# Altium footprint library BRT_Components.PcbLib: 132 footprints (part 2 of 9)
Each footprint in its own frame and in the unit in brackets; x right, y up, seen from the top. Pads: shape width x height; smd on the part's side, far side on the other; paste and mask are expansions set on the pad; w line width, h text height; cw(c..) or ccw(c..) is an arc to the next point about the centre after c.
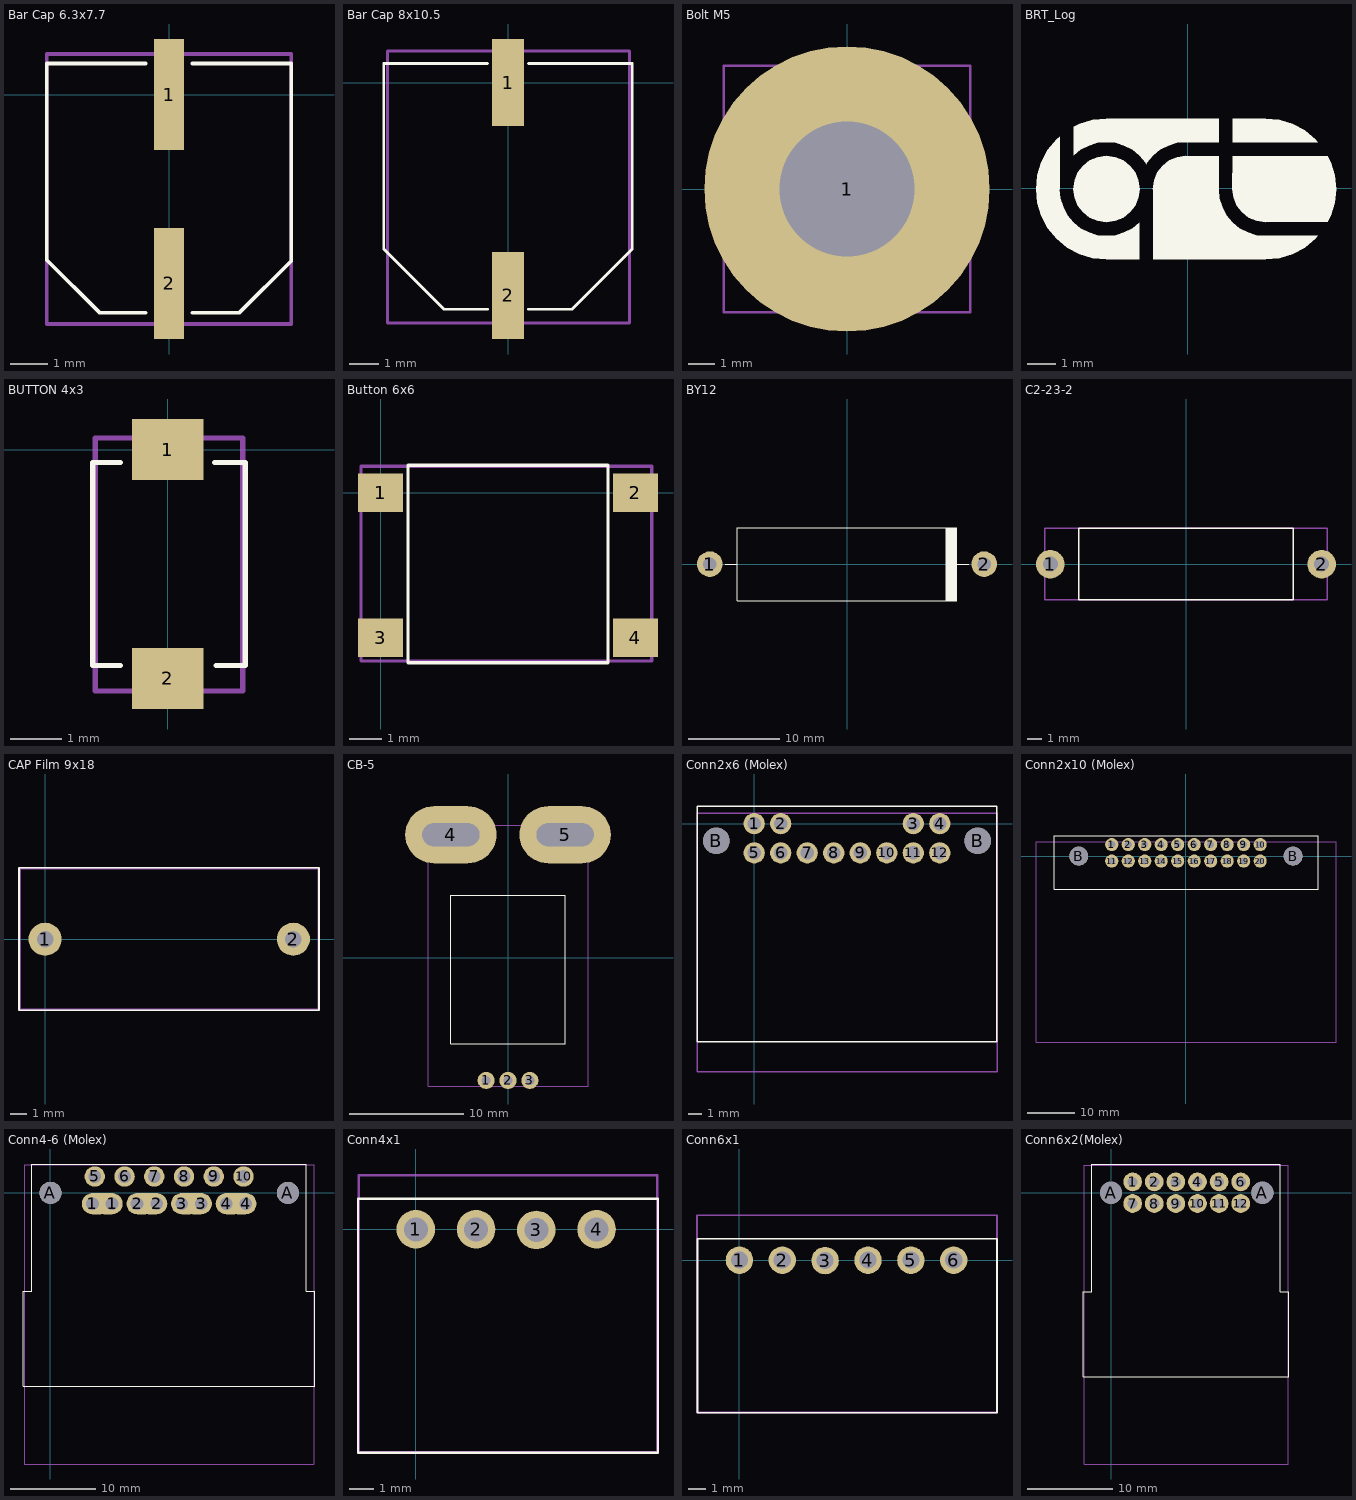
[diagram p1: the footprints below, top view; thin cyan lines are the x and y axes]

## Bar Cap 6.3x7.7 [mm]
pads (2):
  rect 0.8x3 smd: 1(0,0) 2(0,-5.105)
Top Overlay:
  lines w0.1: -0.635,-5.893 -1.88,-5.893 -3.302,-4.47 -3.302,0.838 -0.635,0.838 ; 0.635,-5.893 1.905,-5.893 3.302,-4.496 3.302,0.838 0.635,0.838
Mechanical 13:
  lines w0.1: -3.302,-6.198 -3.302,1.092 3.302,1.092 3.302,-6.198 -3.302,-6.198
3D body "User Library-E-cap_H.step": height 7.7, standoff 0, extent -3.3,-6.19 3.3,1.11

## Bar Cap 8x10.5 [mm]
pads (2):
  rect 1.1x3 smd: 1(0,0) 2(0,-7.325)
Top Overlay:
  lines w0.1: -0.7,-7.8 -2.2,-7.8 -4.275,-5.725 -4.275,0.65 -0.7,0.65 ; 0.7,-7.8 2.2,-7.8 4.275,-5.725 4.275,0.65 0.7,0.65
Mechanical 13:
  lines w0.1: -4.15,-8.275 4.175,-8.275 4.175,1.092 -4.15,1.092 -4.15,-8.275
3D body "User Library-8x10,5F.step": height 10.31, standoff -0.01, extent -4.137,-8.235 4.163,1.065

## Bolt M5 [mm]
pads (1):
  round 11 hole 5.2: 1(0,0)
Bottom Overlay:
  circle w0.254: c0,0 r5.78
Mechanical 13:
  lines w0.1: -4.75,-4.75 4.75,-4.75 4.75,4.75 -4.75,4.75 -4.75,-4.75
3D body "Bolt M5.STEP": height 9.5, standoff -3.24, extent -4.75,-4.75 4.75,4.75

## BRT_Log [mm]
Top Overlay:
  region: -4.57,-0.029 -4.579,-0.029 -4.546,-0.356 -4.451,-0.67 -4.296,-0.959 -4.088,-1.213 -3.834,-1.421 -3.545,-1.576 -3.231,-1.671 -2.904,-1.704 -2.577,-1.671 -2.263,-1.576 -1.973,-1.421 -1.733,-1.224 -1.737,-2.529 -2.904,-2.529 -2.904,-2.541 -3.394,-2.493 -3.865,-2.35 -4.299,-2.118 -4.68,-1.805 -4.993,-1.425 -5.225,-0.99 -5.368,-0.519 -5.416,-0.029 -5.368,0.461 -5.225,0.932 -4.993,1.367 -4.68,1.747 -4.572,1.836
  region: -2.599,1.108 -2.315,0.99 -2.072,0.803 -1.885,0.559 -1.767,0.276 -1.727,-0.029 -1.767,-0.333 -1.885,-0.617 -2.072,-0.861 -2.315,-1.048 -2.599,-1.166 -2.904,-1.206 -3.208,-1.166 -3.492,-1.048 -3.736,-0.861 -3.923,-0.617 -4.04,-0.333 -4.081,-0.029 -4.04,0.276 -3.923,0.559 -3.736,0.803 -3.492,0.99 -3.208,1.108 -2.904,1.148
  region: 1.096,2.471 1.096,1.638 -0.071,1.638 -0.071,1.646 -0.397,1.614 -0.711,1.518 -1.001,1.364 -1.255,1.155 -1.463,0.902 -1.487,0.856 -1.511,0.902 -1.72,1.155 -1.973,1.364 -2.263,1.518 -2.577,1.614 -2.904,1.646 -3.231,1.614 -3.545,1.518 -3.834,1.364 -4.075,1.166 -4.07,2.182 -4.071,2.182 -3.865,2.292 -3.394,2.435 -2.904,2.483
  region: 3.253,2.435 3.724,2.292 4.158,2.06 4.539,1.747 4.628,1.639 1.596,1.638 1.596,2.471 2.763,2.471 2.763,2.483
  region: 5.084,0.932 5.227,0.461 5.275,-0.029 5.227,-0.519 5.084,-0.99 4.974,-1.196 2.763,-1.196 2.763,-1.206 2.458,-1.166 2.174,-1.048 1.931,-0.861 1.744,-0.617 1.626,-0.333 1.586,-0.029 1.596,1.138 4.974,1.138
  region: 1.096,1.138 1.096,-0.029 1.088,-0.029 1.12,-0.356 1.216,-0.67 1.37,-0.959 1.579,-1.213 1.832,-1.421 2.122,-1.576 2.436,-1.671 2.763,-1.704 4.626,-1.696 4.628,-1.697 4.539,-1.805 4.158,-2.118 3.724,-2.35 3.253,-2.493 2.763,-2.541 -1.237,-2.529 -1.237,-0.029 -1.247,-0.029 -1.207,0.276 -1.09,0.559 -0.903,0.803 -0.659,0.99 -0.375,1.108 -0.071,1.148

## BUTTON 4x3 [mm]
pads (2):
  rect 1.4x1.2 smd: 1(0,0) 2(0,-4.5)
Top Overlay:
  lines w0.1: -0.925,-4.25 -1.475,-4.25 -1.475,-0.25 -0.925,-0.25 ; 0.925,-0.25 1.525,-0.25 1.525,-4.25 0.95,-4.25
Mechanical 13:
  lines w0.1: -1.425,0.225 1.475,0.225 1.475,-4.75 -1.425,-4.75 -1.425,0.225 ; -1.425,0.225 -1.425,0.225
3D body "3x4x2 tact button.step": height 2, standoff 0, extent -1.425,-4.775 1.475,0.225

## Button 6x6 [mm]
pads (4):
  rect 1.4x1.2 smd: 1(0,0) 2(7.9,0) 3(0,-4.5) 4(7.9,-4.5)
Top Overlay:
  lines w0.1: 0.85,-5.275 0.85,0.85 7.05,0.85 7.05,-5.275 0.85,-5.275
Mechanical 13:
  lines w0.1: -0.608,-5.216 -0.608,0.816 8.409,0.816 8.409,-5.216 -0.608,-5.216
3D body "Tactal Switch - SMD (6mmx 6mmx 4.3mm) - Marked.stp": height 4.3, standoff 0, extent -0.608,-5.216 8.409,0.816

## BY12 [mm]
pads (2):
  round 2.8 hole 1.5: 1(-15,0) 2(15,0)
Top Overlay:
  rectangle: 10.75,-4 12,4.025
  lines w0.1: -13.325,0 -12,0 ; 12,0 13.325,0 ; -12,-4 12,-4 12,4 -12,4 -12,-4

## C2-23-2 [mm]
pads (2):
  round 2 hole 1.04: 1(-9.475,0) 2(9.475,0)
Top Overlay:
  lines w0.1: -7.5,-2.475 -7.5,2.5 7.5,2.5 7.5,-2.475 -7.5,-2.475
Mechanical 13:
  lines w0.1: -9.85,-2.475 9.85,-2.475 9.85,2.5 -9.85,2.5 -9.85,-2.475
3D body "C2-23-2.step": height 6.49, standoff -3, extent -9.845,-2.476 9.845,2.509

## CAP Film 9x18 [mm] "DS1069-6 MR"
pads (2):
  round 2 hole 1: 1(0,0) 2(15,0)
Top Overlay:
  lines w0.1: -1.575,-4.3 16.55,-4.3 16.55,4.325 -1.575,4.325 -1.575,-4.3
Mechanical 13:
  lines w0.1: -1.5,-4.25 16.5,-4.25 16.5,4.25 -1.5,4.25 -1.5,-4.25
3D body "f862bp224k310alr0l.stp": height 14.5, standoff -30, extent -1.5,-4.255 16.5,4.25

## CB-5 [mm] "ACS758SCB"
pads (5):
  round 1.5 hole 0.8: 1(-1.91,-10.75) 2(0,-10.75) 3(1.91,-10.75)
  rrect100% 8x5 hole 2 slot 5 at 0 deg: 4(-5,10.75) 5(5,10.75)
Top Overlay:
  lines w0.1: -5,-7.55 5,-7.55 5,5.45 -5,5.45 -5,-7.55
Mechanical 13:
  lines w0.1: -7,-11.25 -7,11.575 7,11.575 7,-11.25 -7,-11.25
3D body "ACS754SCB-200-PFF.STEP": height 7, standoff -3.51, extent -7,-11.25 7,11.572

## Conn2x6 (Molex) [mm]
pads (14):
  round 1.6 hole 1: 1(0,0) 2(2,0) 3(12,0) 4(14,0) 5(0,-2.2) 6(2,-2.2) 7(4,-2.2) 8(6,-2.2) 9(8,-2.2) 10(10,-2.2) 11(12,-2.2) 12(14,-2.2)
  round 2 hole 2: B(-2.85,-1.3) B(16.85,-1.3)
Top Overlay:
  lines w0.1: -4.3,-16.45 18.3,-16.45 18.3,1.3 -4.3,1.3 -4.3,0.8 -4.3,-16.45
Mechanical 13:
  lines w0.1: -4.315,-18.7 18.315,-18.7 18.315,0.8 -4.315,0.8 -4.315,-18.7
3D body "Conn2x6(Molex).stp": height 12.84, standoff -3.05, extent -4.315,-18.7 18.315,0.8

## Conn2x10 (Molex) [mm]
pads (22):
  round 2.8 hole 1.5: 1(-15.75,2.46) 2(-12.25,2.46) 3(-8.75,2.46) 4(-5.25,2.46) 5(-1.75,2.46) 6(1.75,2.46) 7(5.25,2.46) 8(8.75,2.46) 9(12.25,2.46) 10(15.75,2.46) 11(-15.75,-1.04) 12(-12.25,-1.04) 13(-8.75,-1.04) 14(-5.25,-1.04) 15(-1.75,-1.04) 16(1.75,-1.04) 17(5.25,-1.04) 18(8.75,-1.04) 19(12.25,-1.04) 20(15.75,-1.04)
  round 4 hole 4: B(-22.75,0) B(22.75,0)
Top Overlay:
  lines w0.1: -27.925,-7.075 -27.925,-0.805 -27.925,4.35 28.05,4.35 28.05,-7.075 -27.925,-7.075
Mechanical 13:
  lines w0.1: -31.825,-39.525 -31.825,3.05 31.85,3.05 31.85,-39.525 -31.825,-39.525
3D body "348302003.stp": height 21.43, standoff -5.06, extent -31.845,-39.52 31.845,3.04

## Conn4-6 (Molex) [mm]
pads (16):
  oval 3.5x2.5 hole 1.5 copper offset 0.5,0: 1(4.945,-1.27) 2(10.195,-1.27) 3(15.445,-1.27) 4(20.695,-1.27)
  oval 3.5x2.5 hole 1.5 copper offset -0.5,0: 1(7.245,-1.27) 2(12.495,-1.27) 3(17.745,-1.27) 4(22.995,-1.27)
  round 2.4 hole 1.5: 5(5.22,1.93) 6(8.72,1.93) 7(12.22,1.93) 8(15.72,1.93) 9(19.22,1.93) 10(22.72,1.93)
  round 2.6 hole 2.6: A(0,0) A(27.94,0)
Top Overlay:
  lines w0.1: -3.2,-22.74 -3.2,-11.6 -2.2,-11.6 -2.2,3.4 30.1,3.4 30.1,-11.6 31.1,-11.6 31.1,-22.74 ; -3.2,-22.74 31.1,-22.75
Mechanical 13:
  lines w0.1: -3.1,-31.9 -3.1,3.3 31,3.3 31,-31.9 -3.1,-31.9
3D body "346960100.stp": height 22.26, standoff -3.3, extent -3.13,-31.887 30.97,3.275

## Conn4x1 [mm] "DS1069-6 MR"
pads (4):
  round 1.6 hole 1: 1(0,0) 2(2.5,0) 3(5,-0.025) 4(7.5,0)
Top Overlay:
  lines w0.1: -2.4,-9.275 -2.4,1.275 10.05,1.275 10.05,-9.275 -2.4,-9.275
Mechanical 13:
  lines w0.1: -2.375,-9.25 -2.375,2.25 10.025,2.25 10.025,-9.25 -2.375,-9.25
3D body "Conn4x1.step": height 5.85, standoff -3.3, extent -2.375,-9.25 10.025,2.25

## Conn6x1 [mm] "DS1069-6 MR"
pads (6):
  round 1.6 hole 1: 1(0,0) 2(2.5,0) 3(5,-0.025) 4(7.5,0) 5(10,0) 6(12.5,0)
Top Overlay:
  lines w0.1: -2.45,-8.9 15.025,-8.9 15.025,1.25 -2.45,1.25 -2.45,-8.9
Mechanical 13:
  lines w0.1: -2.475,-8.88 -2.475,2.62 15.025,2.62 15.025,-8.88 -2.475,-8.88
3D body "Conn6x1.step": height 5.75, standoff -3.5, extent -2.475,-8.88 15.025,2.62

## Conn6x2(Molex) [mm]
pads (14):
  round 2.2 hole 1.2: 1(2.54,1.27) 2(5.08,1.27) 3(7.62,1.27) 4(10.16,1.27) 5(12.7,1.27) 6(15.24,1.27) 7(2.54,-1.27) 8(5.08,-1.27) 9(7.62,-1.27) 10(10.16,-1.27) 11(12.7,-1.27) 12(15.24,-1.27)
  round 2.6 hole 2.6 unplated: A(0,0) A(17.78,0)
Top Overlay:
  lines w0.1: -3.25,-11.625 -2.25,-11.625 -2.25,3.375 19.875,3.375 19.875,-11.625 20.875,-11.625 20.875,-21.625 -3.25,-21.625 -3.25,-11.625 ; -3.25,-11.625 -3.25,-11.625
Mechanical 13:
  lines w0.1: -3.15,-31.875 -3.15,3.225 20.8,3.225 20.8,-31.875 -3.15,-31.875
3D body "346910120.stp": height 22.06, standoff -3.4, extent -3.15,-31.932 20.79,3.232